# Altium footprint library Lib_Global (1).PcbLib: 60 footprints (part 4 of 4)
Each footprint in its own frame and in the unit in brackets; x right, y up, seen from the top. Pads: shape width x height; smd on the part's side, far side on the other; paste and mask are expansions set on the pad; w line width, h text height; cw(c..) or ccw(c..) is an arc to the next point about the centre after c.
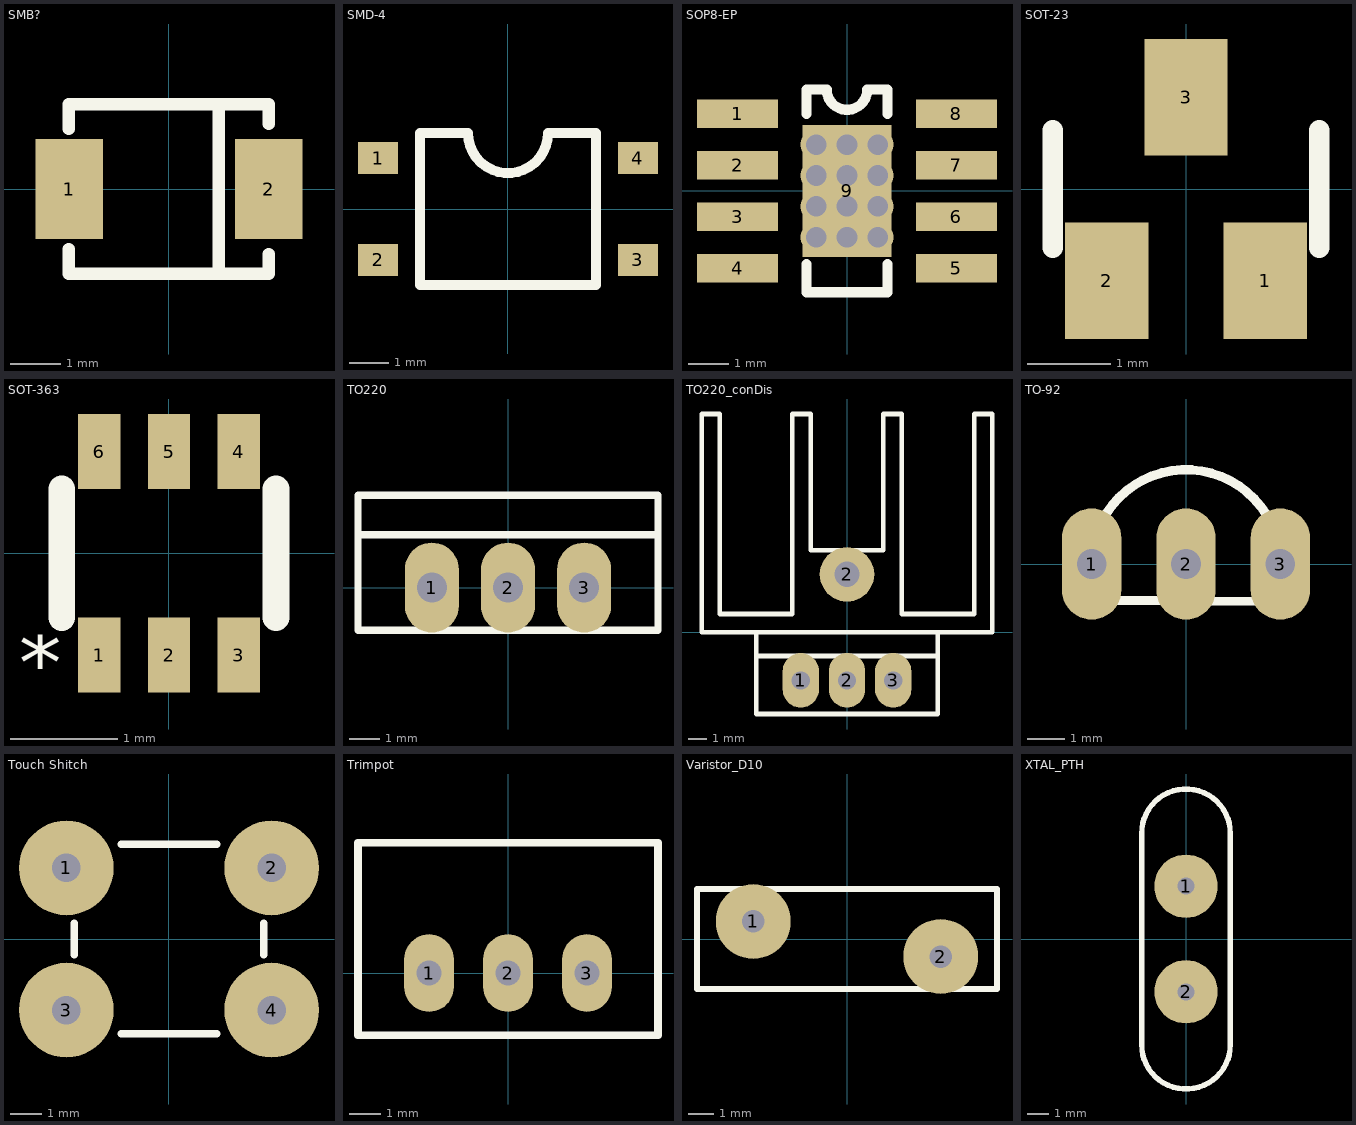
[diagram p3: the footprints below, top view; thin cyan lines are the x and y axes]

## SMB? [mm]
pads (2):
  rect 1.35x2 smd: 1(-2,0) 2(2,0)
Top Overlay:
  lines w0.25: -2,-1.2 -2,-1.3 -2,-1.7 2,-1.7 2,-1.3 ; -2,1.2 -2,1.7 2,1.7 2,1.3 ; 1,-1.7 1,1.7

## SMD-4 [mm]
pads (4):
  rect 1x0.8 smd: 1(-3.25,1.27) 2(-3.25,-1.27) 3(3.25,-1.27) 4(3.25,1.27)
Top Overlay:
  lines w0.25: -2.2,-1.9 -2.2,1.9 -1,1.9 ccw(c0,1.9) 1,1.9 2.2,1.9 2.2,-1.9 -2.2,-1.9

## SOP8-EP [mm]
pads (9):
  rect 2x0.7 smd: 1(-2.7,1.905) 2(-2.7,0.635) 3(-2.7,-0.635) 4(-2.7,-1.905) 5(2.7,-1.905) 6(2.7,-0.635) 7(2.7,0.635) 8(2.7,1.905)
  rect 2.2x3.25 smd: 9(0,0)
via 0,-1.143 diameter 0.762 hole 0.508
via 0.762,-1.143 diameter 0.762 hole 0.508
via 0.762,1.143 diameter 0.762 hole 0.508
via 0.762,0.381 diameter 0.762 hole 0.508
via 0,0.381 diameter 0.762 hole 0.508
via 0,-0.381 diameter 0.762 hole 0.508
via -0.762,-0.381 diameter 0.762 hole 0.508
via 0,1.143 diameter 0.762 hole 0.508
via -0.762,1.143 diameter 0.762 hole 0.508
via -0.762,0.381 diameter 0.762 hole 0.508
via 0.762,-0.381 diameter 0.762 hole 0.508
via -0.762,-1.143 diameter 0.762 hole 0.508
Top Overlay:
  lines w0.25: -1,-1.8 -1,-2.5 1,-2.5 1,-1.8 ; -1,1.9 -1,2.5 -0.5,2.5 ccw(c0,2.5) 0.5,2.5 1,2.5 1,1.9

## SOT-23 [mm]
pads (3):
  rect 1x1.4 smd mask+0.2: 1(0.95,-1.1) 2(-0.95,-1.1) 3(0,1.1)
Top Overlay:
  lines w0.25: -1.6,-0.7 -1.6,0.7 ; 1.6,-0.7 1.6,0.7
3D body "CircuitWorks-SOT-23.SLDPRT": height 1.05, standoff -0.05, extent -1.5,-1.25 1.5,1.25

## SOT-363 [mm]
pads (6):
  rect 0.395x0.7 smd: 1(-0.65,-0.95) 2(0,-0.95) 3(0.65,-0.95) 4(0.65,0.95) 5(0,0.95) 6(-0.65,0.95)
Top Overlay:
  lines w0.25: -1,-0.6 -1,0.6 ; 1,-0.6 1,0.6
  text "*" at -1,-1.5 h1

## TO220 [mm]
pads (3):
  oval 1.8x3 hole 1: 1(-2.54,0) 2(0,0) 3(2.54,0)
Top Overlay:
  lines w0.25: -5,1.765 5,1.765 ; -5,-1.425 -5,3.075 5,3.075 5,-1.425 -5,-1.425
3D body: height 29.5, standoff 0, extent 1.5,-5 1.5,-5
3D body "CircuitWorks-TO-220HS.SLDPRT": height 18.54, standoff -3.81, extent -5.08,-1.447 5.08,3.125

## TO220_conDis [mm]
pads (4):
  oval 2x3 hole 1: 1(-2.54,-2.65) 2(0,-2.65) 3(2.54,-2.65)
  round 3 hole 1.4: 2(0,3.175)
Top Overlay:
  lines w0.25: -5,-1.31 5,-1.31 ; -5,0 -5,-4.5 5,-4.5 5,0 ; -3,0 -8,0 ; -8,0 -8,12 -7,12 -7,1 -3,1 -3,12 -2,12 -2,4.5 2,4.5 2,12 3,12 3,1 7,1 7,12 8,12 8,0 -8,0
3D body "v7700w.SLDPRT": height 25, standoff -4.5, extent -8,0 8,16

## TO-92 [mm]
pads (3):
  oval 1.6x3 hole 0.8: 1(-2.54,0) 2(0,0) 3(2.54,0)
Top Overlay:
  lines w0.25: -2.345,-0.977 cw(c0,0) 2.329,-1.013 -2.345,-0.977
3D body "User Library-TO-92-2.54-line-1_User Library-TO-92 Version2_TO-92 Part5.sldprt": height 6, standoff -2.7, extent 1.1,-0.24 2.886,0.24
3D body "User Library-TO-92-2.54-line-1_User Library-TO-92 Version2_TO-92 Part4.sldprt": height 6, standoff -2.7, extent -2.78,-0.24 -1,0.24
3D body "User Library-TO-92-2.54-line-1_User Library-TO-92 Version2_TO-92 Part3.sldprt": height 6, standoff -2.7, extent -0.255,-0.24 0.255,0.24
3D body: height 6, standoff -2.7, extent -1.1,-1.8 -1.1,-1.8
3D body "User Library-TO-92-2.54-line-1_User Library-TO-92 Version2_TO-92 Part1.sldprt": height 10.7, standoff 6, extent -2.3,-1.76 2.4,2.17

## Touch Shitch [mm]
pads (4):
  round 3 hole 0.9: 1(-3.25,2.25) 2(3.25,2.25) 3(-3.25,-2.25) 4(3.25,-2.25)
Top Overlay:
  lines w0.25: -3,-0.5 -3,0.5 ; -1.5,-3 1.5,-3 ; -1.5,3 1.5,3 ; 3,-0.5 3,0.5
3D body "User Library-Panasonic-EVQPA-Pushbutton.sldprt": height 9.5, standoff -3.5, extent -4.106,-3 4.106,3

## Trimpot [mm]
pads (3):
  oval 1.6x2.5 hole 0.8 mask+0.102: 1(-2.54,0) 2(0,0) 3(2.54,0)
Top Overlay:
  lines w0.25: -4.826,-2 4.826,-2 4.826,4.191 -4.826,4.191 -4.826,-2
3D body "User Library-3299W-1-103RLF.sldprt": height 11.56, standoff -6.22, extent -4.763,-1.905 4.763,4.191

## Varistor_D10 [mm]
pads (2):
  round 3 hole 0.9: 1(-3.75,0.7) 2(3.75,-0.7)
Top Overlay:
  lines w0.25: -6,-2 -6,2 6,2 6,-2 -6,-2
3D body "User Library-S10K275_2.sldprt": height 13, standoff -2.5, extent -6,0.002 5.999,1.902
3D body "User Library-S10K275_1.sldprt": height 13, standoff -2.5, extent -5.999,-1.9 6,0

## XTAL_PTH [mm]
pads (2):
  round 3 hole 0.8 mask+0.2: 1(0,2.5) 2(0,-2.5)
Top Overlay:
  lines w0.25: -2.1,-5 -2.1,5 ; 2.1,-5 2.1,5
  lines w0.254: -2.1,-5 ccw(c0,-5) 2.1,-5 ; -2.1,5 cw(c0,5) 2.1,5
3D body "CircuitWorks-XTAL1.SLDPRT": height 11.68, standoff -2.54, extent -1.524,-5.294 1.524,5.374